# Altium footprint library Connectors.PcbLib: 69 footprints (part 2 of 5)
Each footprint in its own frame and in the unit in brackets; x right, y up, seen from the top. Pads: shape width x height; smd on the part's side, far side on the other; paste and mask are expansions set on the pad; w line width, h text height; cw(c..) or ccw(c..) is an arc to the next point about the centre after c.
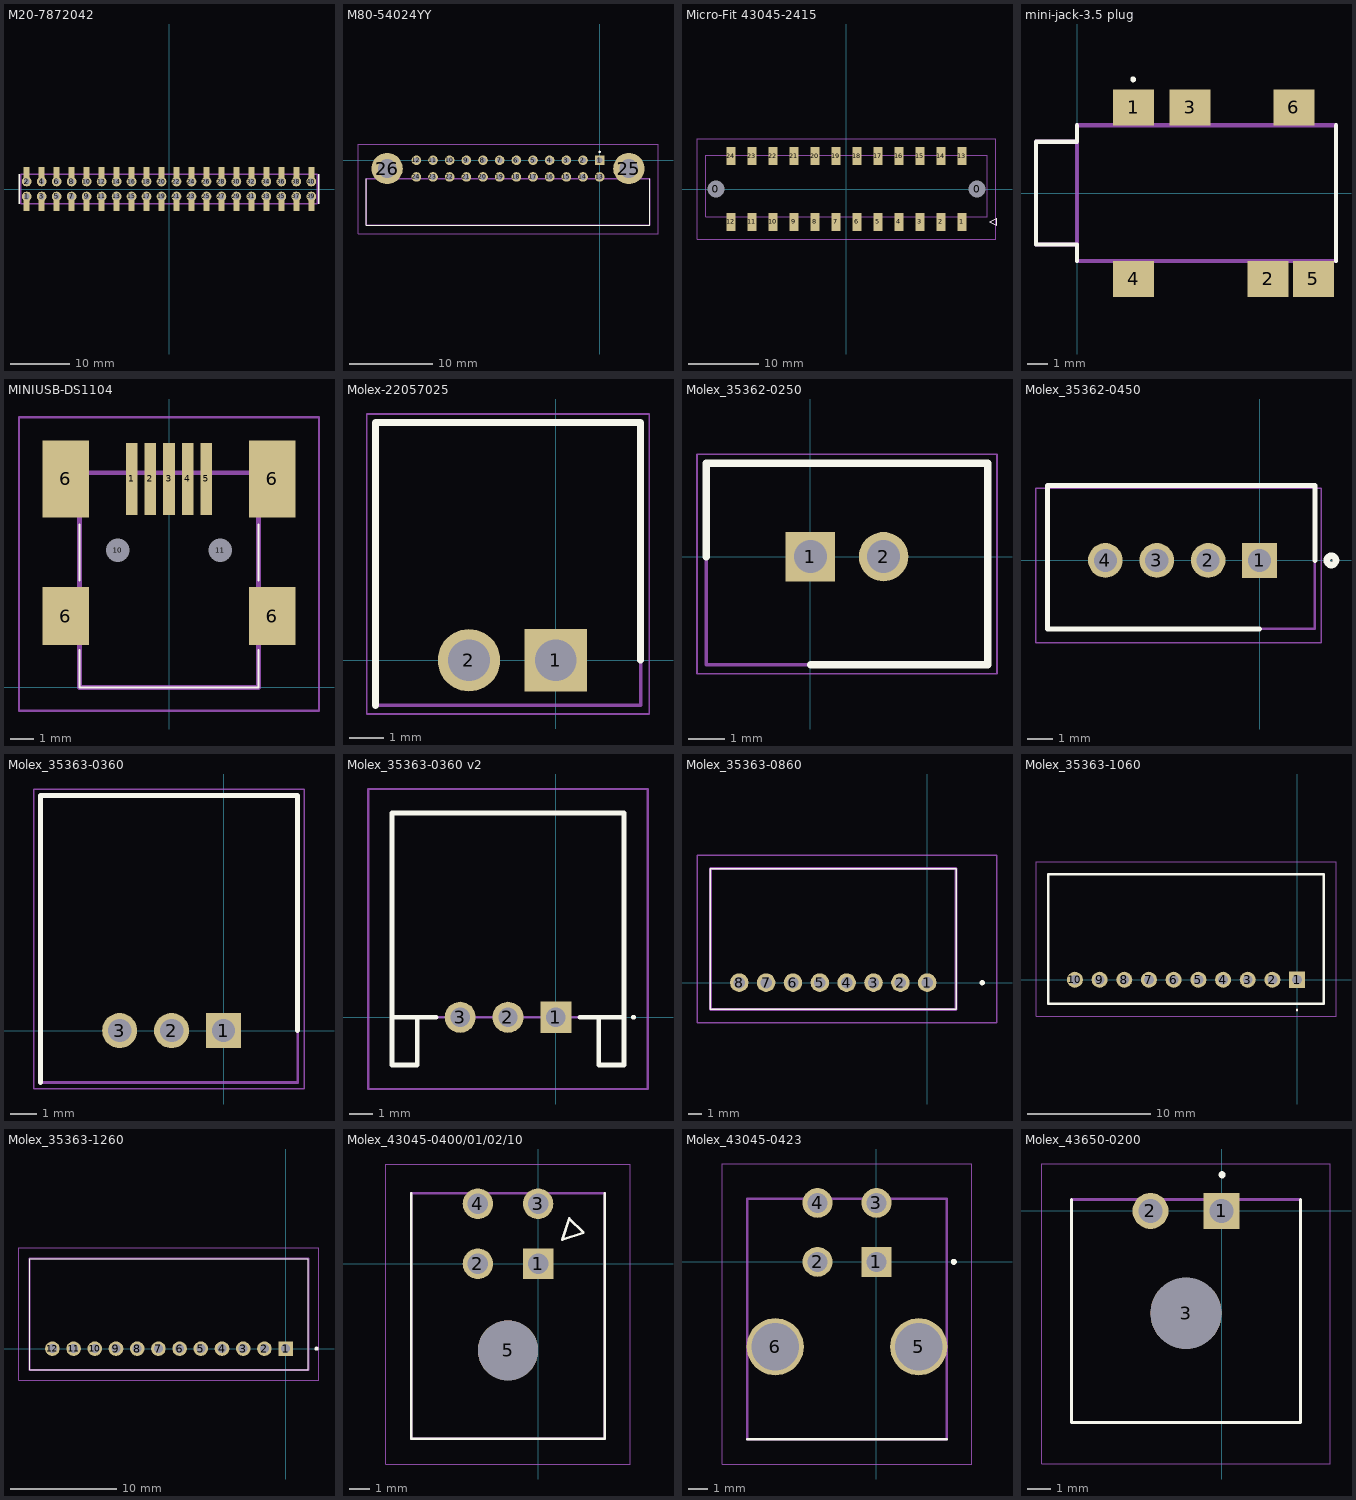
[diagram p1: the footprints below, top view; thin cyan lines are the x and y axes]

## M20-7872042 [mm]
pads (80):
  rect 1.02x1.85 smd: 1(-24.13,-2.825) 2(-24.13,2.825) 3(-21.59,-2.825) 4(-21.59,2.825) 5(-19.05,-2.825) 6(-19.05,2.825) 7(-16.51,-2.825) 8(-16.51,2.825) 9(-13.97,-2.825) 10(-13.97,2.825) 11(-11.43,-2.825) 12(-11.43,2.825) 13(-8.89,-2.825) 14(-8.89,2.825) 15(-6.35,-2.825) 16(-6.35,2.825) 17(-3.81,-2.825) 18(-3.81,2.825) 19(-1.27,-2.825) 20(-1.27,2.825) 21(1.27,-2.825) 22(1.27,2.825) 23(3.81,-2.825) 24(3.81,2.825) 25(6.35,-2.825) 26(6.35,2.825) 27(8.89,-2.825) 28(8.89,2.825) 29(11.43,-2.825) 30(11.43,2.825) 31(13.97,-2.825) 32(13.97,2.825) 33(16.51,-2.825) 34(16.51,2.825) 35(19.05,-2.825) 36(19.05,2.825) 37(21.59,-2.825) 38(21.59,2.825) 39(24.13,-2.825) 40(24.13,2.825)
  round 1.65 hole 1 mask+0.05: 1(-24.13,-1.27) 2(-24.13,1.27) 3(-21.59,-1.27) 4(-21.59,1.27) 5(-19.05,-1.27) 6(-19.05,1.27) 7(-16.51,-1.27) 8(-16.51,1.27) 9(-13.97,-1.27) 10(-13.97,1.27) 11(-11.43,-1.27) 12(-11.43,1.27) 13(-8.89,-1.27) 14(-8.89,1.27) 15(-6.35,-1.27) 16(-6.35,1.27) 17(-3.81,-1.27) 18(-3.81,1.27) 19(-1.27,-1.27) 20(-1.27,1.27) 21(1.27,-1.27) 22(1.27,1.27) 23(3.81,-1.27) 24(3.81,1.27) 25(6.35,-1.27) 26(6.35,1.27) 27(8.89,-1.27) 28(8.89,1.27) 29(11.43,-1.27) 30(11.43,1.27) 31(13.97,-1.27) 32(13.97,1.27) 33(16.51,-1.27) 34(16.51,1.27) 35(19.05,-1.27) 36(19.05,1.27) 37(21.59,-1.27) 38(21.59,1.27) 39(24.13,-1.27) 40(24.13,1.27)
Top Overlay:
  lines w0.254: -25.44,-2.5 -25.44,2.5 ; 25.44,-2.5 25.44,2.5
Top 3D Body (Mech13):
  lines w0.254: -25.14,-2.5 -25.14,2.5 25.14,2.5 25.14,-2.5 -25.14,-2.5
3D body "M20-7872042.STEP": height 7.51, standoff 0.01, extent -25.5,-3.25 25.5,3.25

## M80-54024YY [mm]
pads (26):
  rect 1.15x1.15 hole 0.7: 1(0,0)
  round 1.15 hole 0.7: 2(-2,0) 3(-4,0) 4(-6,0) 5(-8,0) 6(-10,0) 7(-12,0) 8(-14,0) 9(-16,0) 10(-18,0) 11(-20,0) 12(-22,0) 13(0,-2) 14(-2,-2) 15(-4,-2) 16(-6,-2) 17(-8,-2) 18(-10,-2) 19(-12,-2) 20(-14,-2) 21(-16,-2) 22(-18,-2) 23(-20,-2) 24(-22,-2)
  round 3.75 hole 2.25: 25(3.5,-1) 26(-25.5,-1)
Top Overlay:
  circle w0.2: c0,1 r0.05
  lines w0.1: -28,-2.2 -28,-7.8 6,-7.8 6,-2.2
Top 3D Body (Mech13):
  lines w0.2: -28,-7.8 6,-7.8 6,-2.2 -28,-2.2 -28,-7.8
Mechanical 15:
  lines w0.05: -29,-8.8 7,-8.8 7,1.9 -29,1.9 -29,-8.8
3D body "M80-5402422.stp": height 5.87, standoff -3.25, extent -28,-7.9 6,1.2

## Micro-Fit 43045-2415 [mm]
pads (26):
  round 2 hole 2.41 unplated: 0(-18.65,0) 0(18.65,0)
  rect 1.27x2.54 smd: 1(16.5,-4.7) 2(13.5,-4.7) 3(10.5,-4.7) 4(7.5,-4.7) 5(4.5,-4.7) 6(1.5,-4.7) 7(-1.5,-4.7) 8(-4.5,-4.7) 9(-7.5,-4.7) 10(-10.5,-4.7) 11(-13.5,-4.7) 12(-16.5,-4.7) 13(16.5,4.7) 14(13.5,4.7) 15(10.5,4.7) 16(7.5,4.7) 17(4.5,4.7) 18(1.5,4.7) 19(-1.5,4.7) 20(-4.5,4.7) 21(-7.5,4.7) 22(-10.5,4.7) 23(-13.5,4.7) 24(-16.5,4.7)
Top Overlay:
  lines w0.127: 20.5,-4.7 21.5,-5.2 21.5,-4.2 20.5,-4.7
Top 3D Body (Mech13):
  lines w0.127: -20.075,-3.95 20.075,-3.95 20.075,4.82 -20.075,4.82 -20.075,-3.95 ; 20.5,-4.7 21.5,-5.2 21.5,-4.2 20.5,-4.7
Mechanical 15:
  lines w0.05: -21.345,-7.189 21.345,-7.189 21.345,7.189 -21.345,7.189 -21.345,-7.189
3D body "43045-2415.stp": height 9.95, standoff -2.01, extent -20.075,-5.6 20.075,5.6

## mini-jack-3.5 plug [mm]
pads (6):
  rect 2x1.75 smd: 1(2.75,4.175) 2(9.3,-4.175) 3(5.5,4.175) 4(2.75,-4.175) 5(11.5,-4.175) 6(10.55,4.175)
Top Overlay:
  circle w0.2: c2.728,5.532 r0.039
  lines w0.2: 0,-3.3 0,-2.5 -2,-2.5 -2,2.5 0,2.5 0,3.3 ; 12.6,-3.3 12.6,3.3
Top 3D Body (Mech13):
  lines w0.2: 0,-2.5 -2,-2.5 -2,2.5 0,2.5 ; 0,-3.3 0,3.3 12.6,3.3 12.6,-3.3 0,-3.3
3D body "Audio Jack 3.5 mm.STEP": height 6, standoff 0, extent -2.3,-3.5 12.6,3.5

## MINIUSB-DS1104 [mm]
pads (11):
  rect 0.5x3.1 smd: 1(-1.6,8.97) 2(-0.8,8.97) 3(0,8.97) 4(0.8,8.97) 5(1.6,8.97)
  rect 2x2.5 smd: 6(-4.45,3.07) 6(4.45,3.07)
  rect 2x3.3 smd: 6(-4.45,8.97) 6(4.45,8.97)
  round 0.5 hole 1 unplated: 10(-2.2,5.9) 11(2.2,5.9)
Top Overlay:
  lines w0.1: -3.85,1.6 -3.85,0 3.85,0 3.85,1.6 ; -3.85,4.6 -3.85,7 ; 3.85,4.6 3.85,7
Top 3D Body (Mech13):
  lines w0.2: -3.85,0 -3.85,9.23 3.85,9.23 3.85,0 -3.85,0
Mechanical 15:
  lines w0.1: -6.45,-1 -6.45,11.62 6.45,11.62 6.45,-1 -6.45,-1
3D body "Miniusb-DS1104.STEP": height 4.03, standoff -0.97, extent -4.95,0 4.95,9.4

## Molex-22057025 [mm]
pads (2):
  rect 1.8x1.8 hole 1.2: 1(0,0)
  round 1.8 hole 1.2: 2(-2.5,0)
Top Overlay:
  lines w0.2: -5.2,-1.3 -5.2,6.85 2.45,6.85 2.45,0
Top 3D Body (Mech13):
  lines w0.1: -5.2,-1.3 2.45,-1.3 2.45,6.85 -5.2,6.85 -5.2,-1.3
Mechanical 15:
  lines w0.05: -5.45,-1.55 2.7,-1.55 2.7,7.1 -5.45,7.1 -5.45,-1.55
3D body "22-05-7025.stp": height 4.88, standoff -3.52, extent -4.86,-1.2 2.54,6.7

## Molex_35362-0250 [mm]
pads (2):
  rect 1.35x1.35 hole 0.9: 1(0,0)
  round 1.35 hole 0.9: 2(2,0)
Top Overlay:
  lines w0.2: -2.85,0 -2.85,2.55 4.85,2.55 4.85,-2.95 0,-2.95
Top 3D Body (Mech13):
  lines w0.1: -2.85,-2.95 4.85,-2.95 4.85,2.55 -2.85,2.55 -2.85,-2.95
Mechanical 15:
  lines w0.05: -3.1,-3.2 5.1,-3.2 5.1,2.8 -3.1,2.8 -3.1,-3.2
3D body "35362-0250.stp": height 8.41, standoff -3.39, extent -2.86,-2.94 4.84,2.61

## Molex_35362-0450 [mm]
pads (4):
  rect 1.35x1.35 hole 0.9: 1(0,0)
  round 1.35 hole 0.9: 2(-2,0) 3(-4,0) 4(-6,0)
Top Overlay:
  circle w0.254: c2.794,0 r0.18
  lines w0.2: 0,-2.667 -8.255,-2.667 -8.255,2.921 2.15,2.921 2.15,0
Top 3D Body (Mech13):
  lines w0.1: -8.255,-2.667 2.15,-2.667 2.15,2.921 -8.255,2.921 -8.255,-2.667
Mechanical 15:
  lines w0.05: -8.7,-3.2 2.4,-3.2 2.4,2.8 -8.7,2.8 -8.7,-3.2
3D body "35362-0450.stp": height 8.5, standoff -3.3, extent -8.198,-2.567 2.102,2.983

## Molex_35363-0360 [mm]
pads (3):
  rect 1.35x1.35 hole 0.9: 1(0,0)
  round 1.35 hole 0.9: 2(-2,0) 3(-4,0)
Top Overlay:
  lines w0.2: -7.05,-2 -7.05,9.05 2.85,9.05 2.85,0
Top 3D Body (Mech13):
  lines w0.1: -7.05,-2 2.85,-2 2.85,9.05 -7.05,9.05 -7.05,-2
Mechanical 15:
  lines w0.05: -7.3,-2.25 3.1,-2.25 3.1,9.3 -7.3,9.3 -7.3,-2.25
3D body "353630360.stp": height 5.34, standoff -3.36, extent -6.81,-1.88 2.89,8.62

## Molex_35363-0360 v2 [mm]
pads (3):
  rect 1.3x1.3 hole 0.8: 1(0,0)
  round 1.3 hole 0.8: 2(-2,0) 3(-4,0)
Top Overlay:
  lines w0.1: 3.2,0 cw(c3.25,0) 3.3,0 cw(c3.25,0) 3.2,0
  lines w0.2: -5.8,0 -5.8,-2 -6.85,-2 -6.85,0 ; -5,0 -6.85,0 ; 1,0 2.85,0 ; 1.8,0 1.8,-2 2.85,-2 2.85,0 ; -6.85,0 -6.85,8.55 2.85,8.55 2.85,0
Top 3D Body (Mech13):
  lines w0.1: -5.8,0 -5.8,-2 -6.85,-2 -6.85,0 ; 1.8,0 1.8,-2 2.85,-2 2.85,0 ; -6.85,0 -6.85,8.55 2.85,8.55 2.85,0 ; -6.85,0 2.85,0
Mechanical 15:
  lines w0.1: -7.85,-3 -7.85,9.55 3.85,9.55 3.85,-3 -7.85,-3
3D body "35363-0360.stp": height 5.43, standoff -3.27, extent -6.85,-1.98 2.85,8.52

## Molex_35363-0860 [mm]
pads (8):
  round 1.381 hole 0.85: 1(0,0) 2(-2,0) 3(-4,0) 4(-6,0) 5(-8,0) 6(-10,0) 7(-12,0) 8(-14,0)
Top Overlay:
  lines w0.1: -16.15,-2 -16.15,8.5 2.15,8.5 2.15,-2 -16.15,-2
  lines w0.2: 4,0 cw(c4.1,0) 4.2,0 cw(c4.1,0) 4,0
Top 3D Body (Mech13):
  lines w0.2: -16.15,-2 -16.15,8.5 2.15,8.5 2.15,-2 -16.15,-2
Mechanical 15:
  lines w0.1: -17.15,-3 -17.15,9.5 5.2,9.5 5.2,-3 -17.15,-3
3D body "35363-0860.stp": height 5.48, standoff -3.22, extent -16.18,-2 2.12,8.5

## Molex_35363-1060 [mm]
pads (10):
  rect 1.3x1.3 hole 0.8: 1(0,0)
  round 1.3 hole 0.8: 2(-2,0) 3(-4,0) 4(-6,0) 5(-8,0) 6(-10,0) 7(-12,0) 8(-14,0) 9(-16,0) 10(-18,0)
Top Overlay:
  lines w0.1: 0,-2.5 cw(c0,-2.45) 0,-2.4 cw(c0,-2.45) 0,-2.5
  lines w0.2: -20.15,-1.95 2.15,-1.95 2.15,8.55 -20.15,8.55 -20.15,-1.95
Top 3D Body (Mech13):
  lines w0.1: -20.15,-1.95 2.15,-1.95 2.15,8.55 -20.15,8.55 -20.15,-1.95
Mechanical 15:
  lines w0.1: -21.15,-2.95 3.15,-2.95 3.15,9.55 -21.15,9.55 -21.15,-2.95
3D body "35363-1060.stp": height 5.56, standoff -3.14, extent -20.15,-1.95 2.15,8.55

## Molex_35363-1260 [mm]
pads (12):
  rect 1.381x1.381 hole 0.85: 1(0,0)
  round 1.381 hole 0.85: 2(-2,0) 3(-4,0) 4(-6,0) 5(-8,0) 6(-10,0) 7(-12,0) 8(-14,0) 9(-16,0) 10(-18,0) 11(-20,0) 12(-22,0)
Top Overlay:
  lines w0.1: -24.15,-2 2.15,-2 2.15,8.5 -24.15,8.5 -24.15,-2
  lines w0.2: 2.821,0 cw(c2.921,0) 3.021,0 cw(c2.921,0) 2.821,0
Top 3D Body (Mech13):
  lines w0.2: -24.15,-2 -24.15,8.5 ; -24.13,-2 2.15,-2 2.15,8.5 -24.13,8.5
Mechanical 15:
  lines w0.1: -25.15,-2.992 3.15,-2.992 3.15,9.525 -25.15,9.525 -25.15,-2.992
3D body "35363-1260.stp": height 5.51, standoff -3.19, extent -24.152,-2.039 2.148,8.461

## Molex_43045-0400/01/02/10 [mm]
pads (5):
  rect 1.52x1.52 hole 1.02: 1(0,0)
  round 1.52 hole 1.02: 2(-3,0) 3(0,3) 4(-3,3)
  round 3 hole 3 unplated: 5(-1.5,-4.32)
Top Overlay:
  lines w0.127: -6.325,3.52 -6.325,-8.72 3.325,-8.72 3.325,3.52 ; 1.2,1.2 1.554,2.261 2.261,1.554 1.2,1.2
Top 3D Body (Mech13):
  lines w0.127: -6.325,-8.72 -6.325,3.52 3.325,3.52 3.325,-8.72 -6.325,-8.72
Mechanical 15:
  lines w0.05: -7.595,-9.99 -7.595,4.979 4.595,4.979 4.595,-9.99 -7.595,-9.99
3D body "43045-0400.stp": height 8.7, standoff -3.25, extent -6.575,-8.925 3.575,3.315

## Molex_43045-0423 [mm]
pads (6):
  rect 1.52x1.52 hole 1.02: 1(0,0)
  round 1.52 hole 1.02: 2(-3,0) 3(0,3) 4(-3,3)
  round 2.91 hole 2.41: 5(2.15,-4.32) 6(-5.15,-4.32)
Top Overlay:
  lines w0.127: -6.575,-9.02 3.575,-9.02
  lines w0.2: 3.937,-0.05 cw(c3.937,0) 3.937,0.05 cw(c3.937,0) 3.937,-0.05
Top 3D Body (Mech13):
  lines w0.127: -6.575,-9.02 -6.575,3.22 3.575,3.22 3.575,-9.02 -6.575,-9.02
Mechanical 15:
  lines w0.05: -7.845,-10.29 -7.845,4.979 4.845,4.979 4.845,-10.29 -7.845,-10.29
3D body "43045-0423.stp": height 8.61, standoff -3.34, extent -6.595,-8.865 3.605,3.375

## Molex_43650-0200 [mm]
pads (3):
  rect 1.52x1.52 hole 1.02: 1(0,0)
  round 1.52 hole 1.02: 2(-3,0)
  round 3 hole 3 unplated: 3(-1.5,-4.32)
Top Overlay:
  lines w0.127: -6.325,0.49 -6.325,-8.93 3.325,-8.93 3.325,0.49
  lines w0.2: 0.025,1.474 ccw(c0.025,1.524) 0.025,1.574 ccw(c0.025,1.524) 0.025,1.474
Top 3D Body (Mech13):
  lines w0.127: -6.325,-8.93 -6.325,0.49 3.325,0.49 3.325,-8.93 -6.325,-8.93
Mechanical 15:
  lines w0.05: -7.595,-10.68 -7.595,1.979 4.595,1.979 4.595,-10.68 -7.595,-10.68
3D body "43650-0200.stp": height 5.58, standoff -3.33, extent -6.325,-8.93 3.325,0.97